# Altium footprint library KNR_Kurs.PcbLib: 250 footprints (part 7 of 16)
Each footprint in its own frame and in the unit in brackets; x right, y up, seen from the top. Pads: shape width x height; smd on the part's side, far side on the other; paste and mask are expansions set on the pad; w line width, h text height; cw(c..) or ccw(c..) is an arc to the next point about the centre after c.
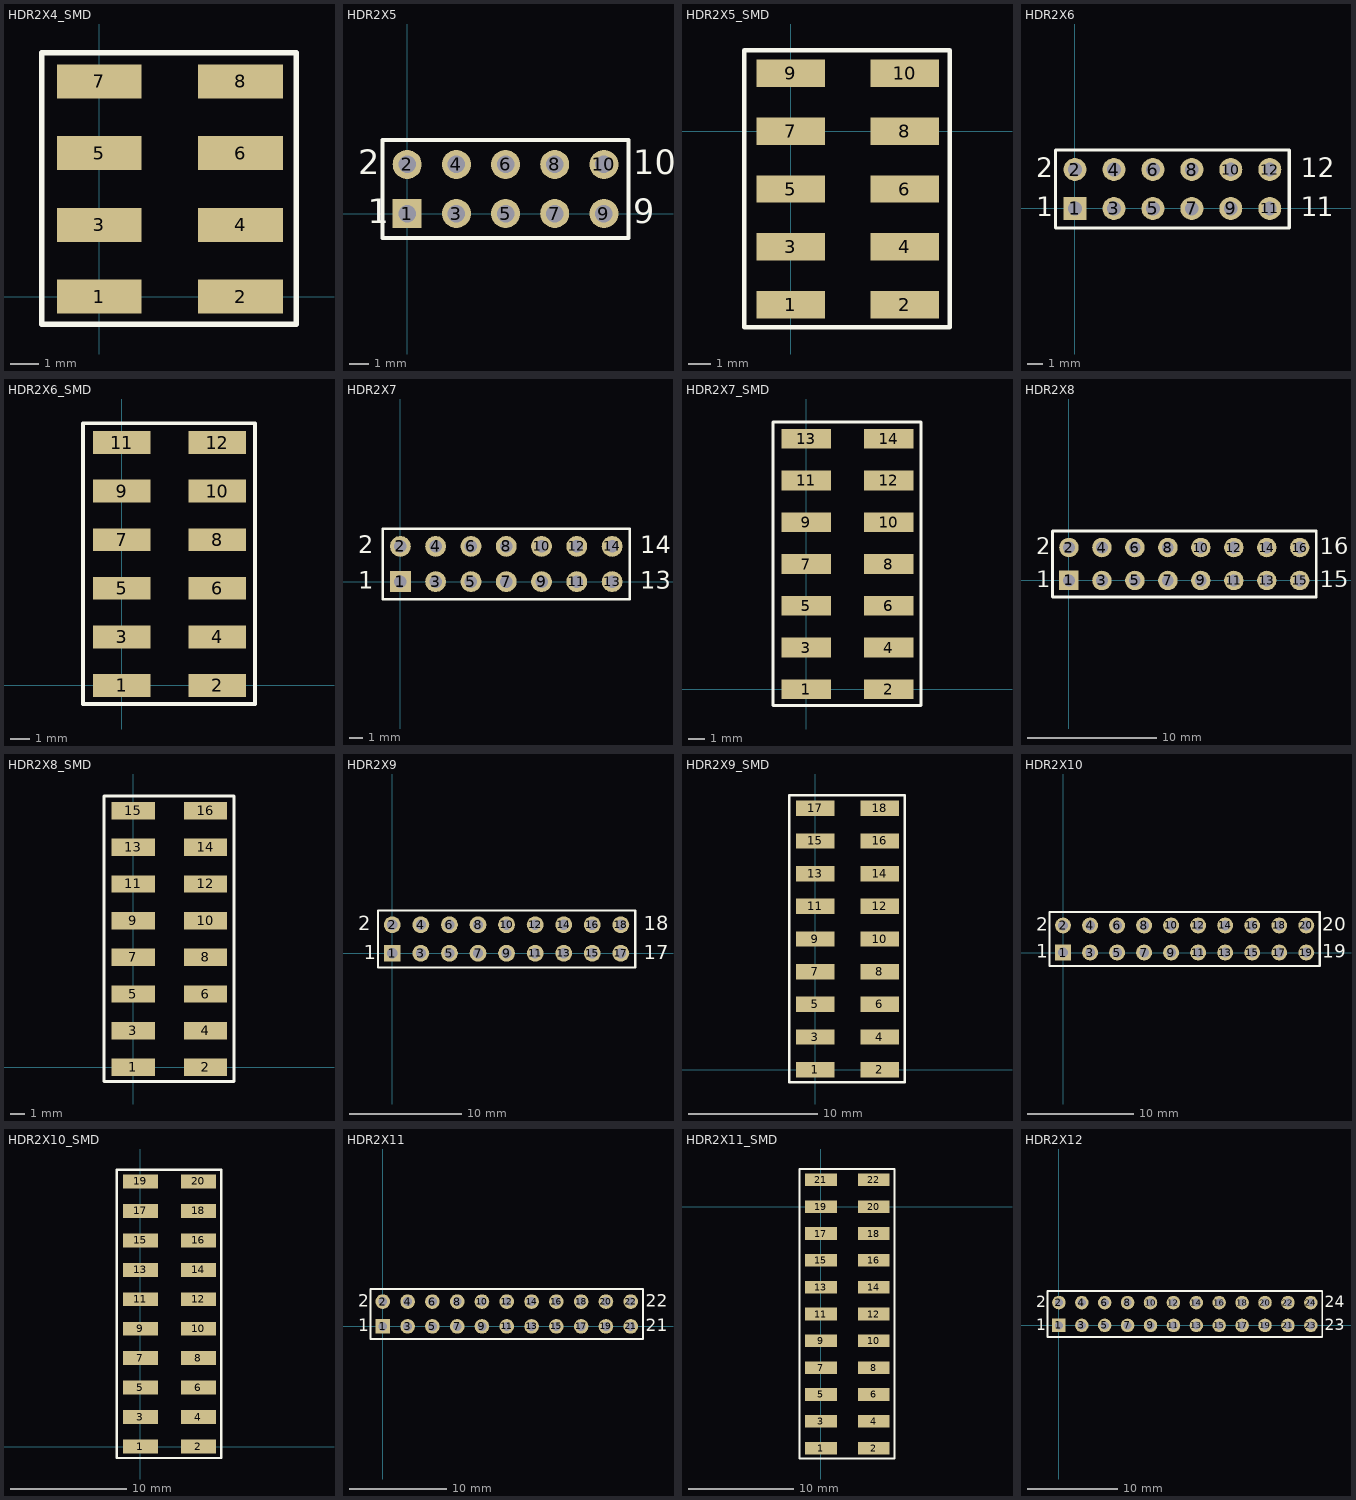
[diagram p6: the footprints below, top view; thin cyan lines are the x and y axes]

## HDR2X4_SMD [mm]
pads (8):
  rect 3x1.2 smd: 1(0,0) 2(5,0) 3(0,2.54) 4(5,2.54) 5(0,5.08) 6(5,5.08) 7(0,7.62) 8(5,7.62)
Top Overlay:
  lines w0.2: -2.032,-0.984 6.968,-0.984 6.968,8.636 -2.032,8.636 -2.032,-0.984
3D body "HDR2X4_SMD.stp": height 9.3, standoff 0, extent -1.15,-1.27 6.15,8.89

## HDR2X5 [mm] "Connector; Header; 5x2 Position"
pads (10):
  rect 1.5x1.5 hole 0.9: 1(0,0)
  round 1.5 hole 0.9: 2(0,2.54) 3(2.54,0) 4(2.54,2.54) 5(5.08,0) 6(5.08,2.54) 7(7.62,0) 8(7.62,2.54) 9(10.16,0) 10(10.16,2.54)
Top Overlay:
  lines w0.2: -1.27,-1.27 -1.27,3.81 11.43,3.81 11.43,-1.27 -1.27,-1.27
  text "2" at -2.54,2.032 h1.27
  text "1" at -2.032,-0.508 h1.27
  text "9" at 11.684,-0.508 h1.27
  text "10" at 11.684,2.032 h1.27
3D body "HDR2X5.stp": height 8.54, standoff -3, extent -1.27,-1.245 11.43,3.835

## HDR2X5_SMD [mm]
pads (10):
  rect 3x1.2 smd: 1(0,-7.62) 2(5,-7.62) 3(0,-5.08) 4(5,-5.08) 5(0,-2.54) 6(5,-2.54) 7(0,0) 8(5,0) 9(0,2.54) 10(5,2.54)
Top Overlay:
  lines w0.2: -2.032,-8.604 6.968,-8.604 6.968,3.556 -2.032,3.556 -2.032,-8.604
3D body "HDR2X5_SMD.stp": height 9.3, standoff 0, extent -1.15,-8.89 6.15,3.81

## HDR2X6 [mm] "Connector; Header; 6x2 Position"
pads (12):
  rect 1.5x1.5 hole 0.9: 1(0,0)
  round 1.5 hole 0.9: 2(0,2.54) 3(2.54,0) 4(2.54,2.54) 5(5.08,0) 6(5.08,2.54) 7(7.62,0) 8(7.62,2.54) 9(10.16,0) 10(10.16,2.54) 11(12.7,0) 12(12.7,2.54)
Top Overlay:
  lines w0.2: -1.27,-1.27 13.97,-1.27 13.97,3.81 -1.27,3.81 -1.27,-1.27
  text "12" at 14.732,2.032 h1.27
  text "1" at 15.748,-0.508 h1.27
  text "1" at 14.732,-0.508 h1.27
  text "1" at -2.54,-0.508 h1.27
  text "2" at -2.54,2.032 h1.27
3D body "HDR2X6.stp": height 8.54, standoff -3, extent -1.219,-1.321 14.021,3.759

## HDR2X6_SMD [mm]
pads (12):
  rect 3x1.2 smd: 1(0,0) 2(5,0) 3(0,2.54) 4(5,2.54) 5(0,5.08) 6(5,5.08) 7(0,7.62) 8(5,7.62) 9(0,10.16) 10(5,10.16) 11(0,12.7) 12(5,12.7)
Top Overlay:
  lines w0.2: -2.032,-0.984 -2.032,13.716 6.968,13.716 6.968,-0.984 -2.032,-0.984
3D body "HDR2X6_SMD.stp": height 9.3, standoff 0, extent -1.15,-1.27 6.15,13.97

## HDR2X7 [mm] "Connector; Header; 7x2 Position"
pads (14):
  rect 1.5x1.5 hole 0.9: 1(0,0)
  round 1.5 hole 0.9: 2(0,2.54) 3(2.54,0) 4(2.54,2.54) 5(5.08,0) 6(5.08,2.54) 7(7.62,0) 8(7.62,2.54) 9(10.16,0) 10(10.16,2.54) 11(12.7,0) 12(12.7,2.54) 13(15.24,0) 14(15.24,2.54)
Top Overlay:
  lines w0.2: -1.27,-1.27 16.51,-1.27 16.51,3.81 -1.27,3.81 -1.27,-1.27
  text "13" at 17.272,-0.508 h1.27
  text "14" at 17.272,2.032 h1.27
  text "1" at -3.048,-0.508 h1.27
  text "2" at -3.048,2.032 h1.27
3D body "HDR2X7.stp": height 8.54, standoff -3, extent -1.245,-1.27 16.535,3.81

## HDR2X7_SMD [mm]
pads (14):
  rect 3x1.2 smd: 1(0,0) 2(5,0) 3(0,2.54) 4(5,2.54) 5(0,5.08) 6(5,5.08) 7(0,7.62) 8(5,7.62) 9(0,10.16) 10(5,10.16) 11(0,12.7) 12(5,12.7) 13(0,15.24) 14(5,15.24)
Top Overlay:
  lines w0.2: -2.032,-0.984 -2.032,16.256 6.968,16.256 6.968,-0.984 -2.032,-0.984
3D body "HDR2X7_SMD.stp": height 9.3, standoff 0, extent -1.15,-1.27 6.15,16.51

## HDR2X8 [mm] "Connector; Header; 8x2 Position"
pads (16):
  rect 1.5x1.5 hole 0.9: 1(0,0)
  round 1.5 hole 0.9: 2(0,2.54) 3(2.54,0) 4(2.54,2.54) 5(5.08,0) 6(5.08,2.54) 7(7.62,0) 8(7.62,2.54) 9(10.16,0) 10(10.16,2.54) 11(12.7,0) 12(12.7,2.54) 13(15.24,0) 14(15.24,2.54) 15(17.78,0) 16(17.78,2.54)
Top Overlay:
  lines w0.2: -1.27,-1.27 19.05,-1.27 19.05,3.81 -1.27,3.81 -1.27,-1.27
  text "16" at 19.304,2.032 h1.27
  text "15" at 19.304,-0.508 h1.27
  text "1" at -2.54,-0.508 h1.27
  text "2" at -2.54,2.032 h1.27
3D body "HDR2X8.stp": height 8.54, standoff -3, extent -1.27,-1.295 19.05,3.785

## HDR2X8_SMD [mm]
pads (16):
  rect 3x1.2 smd: 1(0,0) 2(5,0) 3(0,2.54) 4(5,2.54) 5(0,5.08) 6(5,5.08) 7(0,7.62) 8(5,7.62) 9(0,10.16) 10(5,10.16) 11(0,12.7) 12(5,12.7) 13(0,15.24) 14(5,15.24) 15(0,17.78) 16(5,17.78)
Top Overlay:
  lines w0.2: -2.032,-0.984 -2.032,18.796 6.968,18.796 6.968,-0.984 -2.032,-0.984
3D body "HDR2X8_SMD.stp": height 9.3, standoff 0, extent -1.15,-1.27 6.15,19.05

## HDR2X9 [mm] "Connector; Header; 9x2 Position"
pads (18):
  rect 1.5x1.5 hole 0.9: 1(0,0)
  round 1.5 hole 0.9: 2(0,2.54) 3(2.54,0) 4(2.54,2.54) 5(5.08,0) 6(5.08,2.54) 7(7.62,0) 8(7.62,2.54) 9(10.16,0) 10(10.16,2.54) 11(12.7,0) 12(12.7,2.54) 13(15.24,0) 14(15.24,2.54) 15(17.78,0) 16(17.78,2.54) 17(20.32,0) 18(20.32,2.54)
Top Overlay:
  lines w0.2: -1.27,-1.27 21.59,-1.27 21.59,3.81 -1.27,3.81 -1.27,-1.27
  text "18" at 22.352,2.032 h1.27
  text "17" at 22.352,-0.508 h1.27
  text "1" at -2.54,-0.508 h1.27
  text "2" at -3.048,2.032 h1.27
3D body "HDR2X9.stp": height 8.54, standoff -3, extent -1.245,-1.245 21.615,3.835

## HDR2X9_SMD [mm]
pads (18):
  rect 3x1.2 smd: 1(0,0) 2(5,0) 3(0,2.54) 4(5,2.54) 5(0,5.08) 6(5,5.08) 7(0,7.62) 8(5,7.62) 9(0,10.16) 10(5,10.16) 11(0,12.7) 12(5,12.7) 13(0,15.24) 14(5,15.24) 15(0,17.78) 16(5,17.78) 17(0,20.32) 18(5,20.32)
Top Overlay:
  lines w0.2: -2.032,-0.984 6.968,-0.984 6.968,21.336 -2.032,21.336 -2.032,-0.984
3D body "HDR2X9_SMD.stp": height 9.3, standoff 0, extent -1.15,-1.27 6.15,21.59

## HDR2X10 [mm] "Connector; Header; 10x2 Position"
pads (20):
  rect 1.5x1.5 hole 0.9: 1(0,0)
  round 1.5 hole 0.9: 2(0,2.54) 3(2.54,0) 4(2.54,2.54) 5(5.08,0) 6(5.08,2.54) 7(7.62,0) 8(7.62,2.54) 9(10.16,0) 10(10.16,2.54) 11(12.7,0) 12(12.7,2.54) 13(15.24,0) 14(15.24,2.54) 15(17.78,0) 16(17.78,2.54) 17(20.32,0) 18(20.32,2.54) 19(22.86,0) 20(22.86,2.54)
Top Overlay:
  lines w0.2: -1.27,-1.27 0.635,-1.27 24.13,-1.27 24.13,3.81 0.635,3.81 -1.27,3.81 -1.27,-1.27
  text "20" at 24.384,2.032 h1.27
  text "19" at 24.384,-0.508 h1.27
  text "1" at -2.54,-0.508 h1.27
  text "2" at -2.54,2.032 h1.27
3D body "HDR2X10.stp": height 8.54, standoff -3, extent -1.245,-1.245 24.155,3.835

## HDR2X10_SMD [mm]
pads (20):
  rect 3x1.2 smd: 1(0,0) 2(5,0) 3(0,2.54) 4(5,2.54) 5(0,5.08) 6(5,5.08) 7(0,7.62) 8(5,7.62) 9(0,10.16) 10(5,10.16) 11(0,12.7) 12(5,12.7) 13(0,15.24) 14(5,15.24) 15(0,17.78) 16(5,17.78) 17(0,20.32) 18(5,20.32) 19(0,22.86) 20(5,22.86)
Top Overlay:
  lines w0.2: -2.032,-0.984 -2.032,23.876 6.968,23.876 6.968,-0.984 -2.032,-0.984
3D body "HDR2X10_SMD.stp": height 9.3, standoff 0, extent -1.15,-1.27 6.15,24.13

## HDR2X11 [mm] "Connector; Header; 11x2 Position"
pads (22):
  rect 1.5x1.5 hole 0.9: 1(0,0)
  round 1.5 hole 0.9: 2(0,2.54) 3(2.54,0) 4(2.54,2.54) 5(5.08,0) 6(5.08,2.54) 7(7.62,0) 8(7.62,2.54) 9(10.16,0) 10(10.16,2.54) 11(12.7,0) 12(12.7,2.54) 13(15.24,0) 14(15.24,2.54) 15(17.78,0) 16(17.78,2.54) 17(20.32,0) 18(20.32,2.54) 19(22.86,0) 20(22.86,2.54) 21(25.4,0) 22(25.4,2.54)
Top Overlay:
  lines w0.2: -1.27,-1.27 26.67,-1.27 26.67,3.81 -1.27,3.81 -1.27,-1.27
  text "22" at 26.924,2.032 h1.27
  text "21" at 26.924,-0.508 h1.27
  text "2" at -2.54,2.032 h1.27
  text "1" at -2.54,-0.508 h1.27
3D body "HDR2X10.stp": height 8.54, standoff -3, extent -1.295,-1.245 24.105,3.835

## HDR2X11_SMD [mm]
pads (22):
  rect 3x1.2 smd: 1(0,-22.86) 2(5,-22.86) 3(0,-20.32) 4(5,-20.32) 5(0,-17.78) 6(5,-17.78) 7(0,-15.24) 8(5,-15.24) 9(0,-12.7) 10(5,-12.7) 11(0,-10.16) 12(5,-10.16) 13(0,-7.62) 14(5,-7.62) 15(0,-5.08) 16(5,-5.08) 17(0,-2.54) 18(5,-2.54) 19(0,0) 20(5,0) 21(0,2.54) 22(5,2.54)
Top Overlay:
  lines w0.2: -2.032,-23.844 6.968,-23.844 6.968,3.556 -2.032,3.556 -2.032,-23.844
3D body "HDR2X11_SMD.stp": height 9.3, standoff 0, extent -1.15,-24.13 6.15,3.81

## HDR2X12 [mm] "Connector; Header; 12x2 Position"
pads (24):
  rect 1.5x1.5 hole 0.9: 1(0,0)
  round 1.5 hole 0.9: 2(0,2.54) 3(2.54,0) 4(2.54,2.54) 5(5.08,0) 6(5.08,2.54) 7(7.62,0) 8(7.62,2.54) 9(10.16,0) 10(10.16,2.54) 11(12.7,0) 12(12.7,2.54) 13(15.24,0) 14(15.24,2.54) 15(17.78,0) 16(17.78,2.54) 17(20.32,0) 18(20.32,2.54) 19(22.86,0) 20(22.86,2.54) 21(25.4,0) 22(25.4,2.54) 23(27.94,0) 24(27.94,2.54)
Top Overlay:
  lines w0.2: -1.27,-1.27 -1.27,3.81 29.21,3.81 29.21,-1.27 -1.27,-1.27
  text "1" at -2.54,-0.508 h1.27
  text "2" at -2.54,2.032 h1.27
  text "23" at 29.464,-0.508 h1.27
  text "24" at 29.464,2.032 h1.27
3D body "HDR2X12.stp": height 8.54, standoff -3, extent -1.27,-1.27 29.21,3.81